# Altium footprint library TriggersLib.PcbLib: 262 footprints (part 1 of 17)
Each footprint in its own frame and in the unit in brackets; x right, y up, seen from the top. Pads: shape width x height; smd on the part's side, far side on the other; paste and mask are expansions set on the pad; w line width, h text height; cw(c..) or ccw(c..) is an arc to the next point about the centre after c.
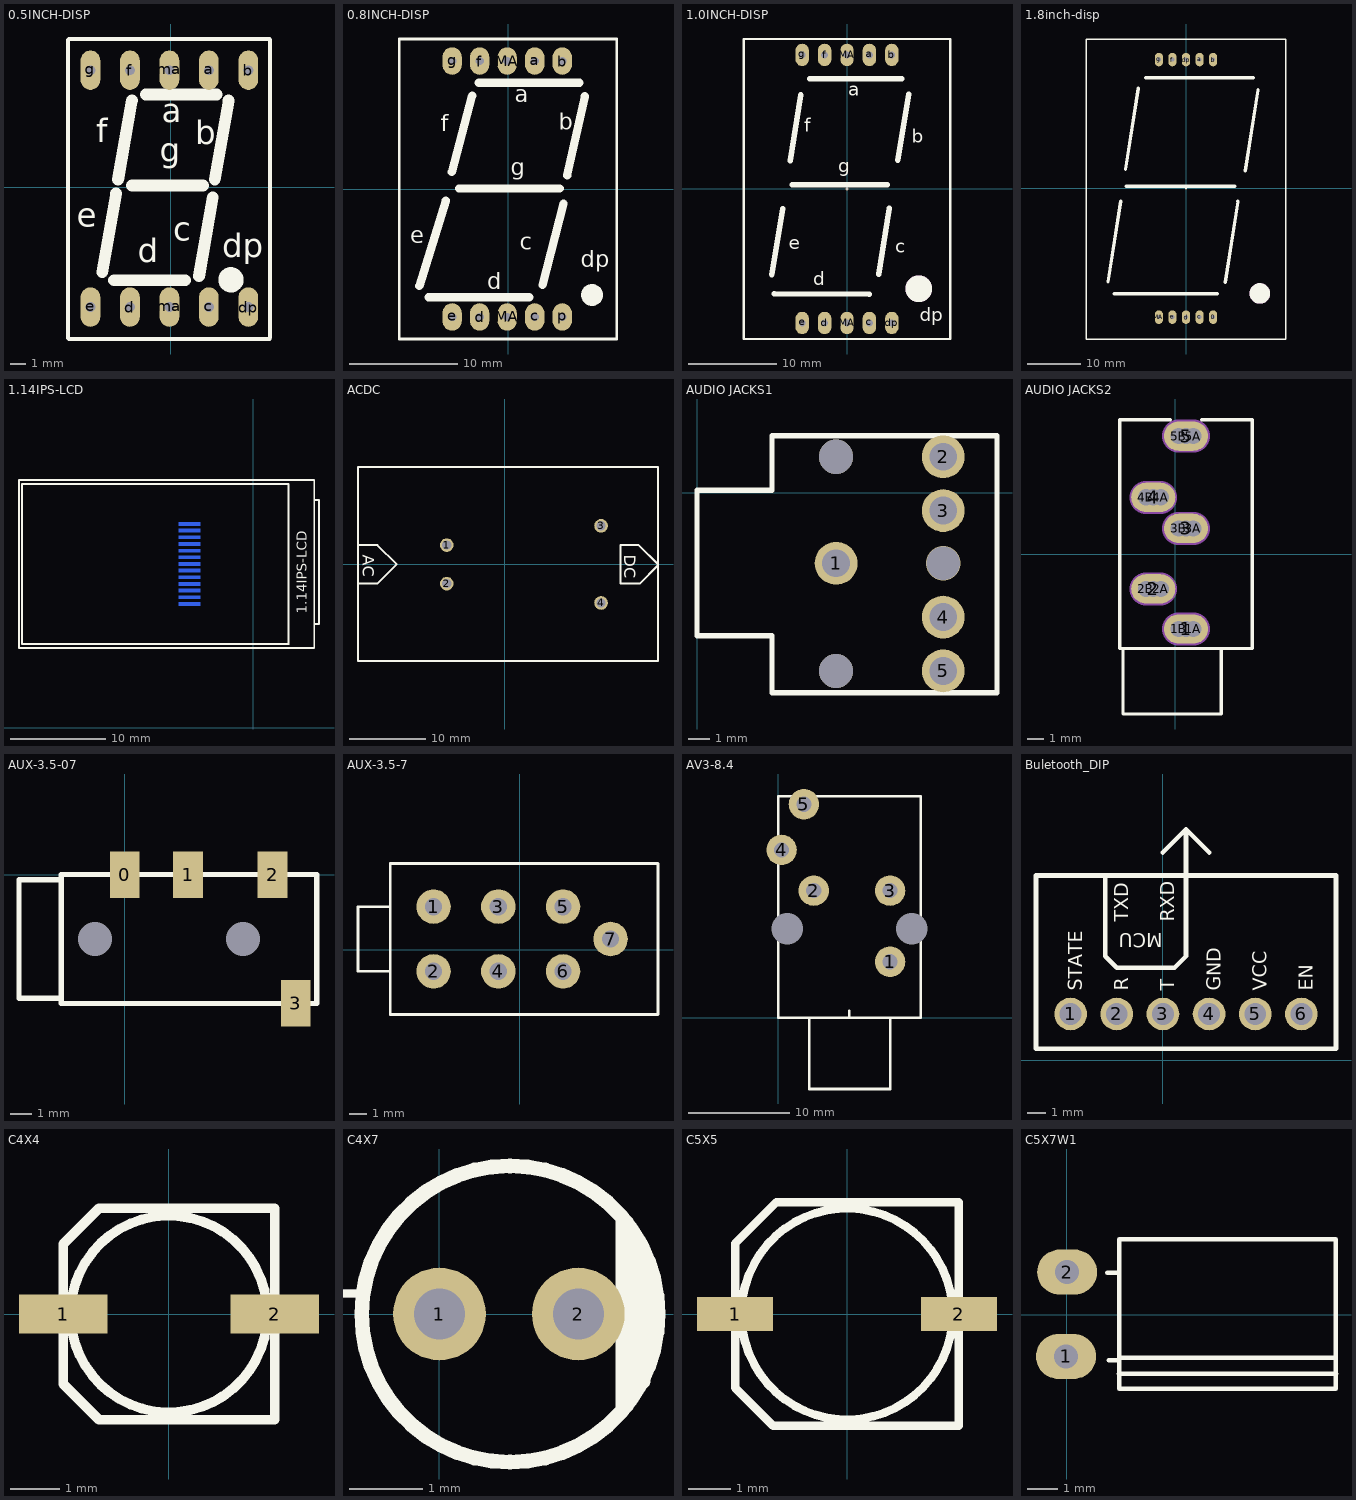
[diagram p0: the footprints below, top view; thin cyan lines are the x and y axes]

## 0.5INCH-DISP [mil]
pads (10):
  oval 50x100 hole 25: a(97,297) b(197,297) c(97,-303) d(-103,-303) dp(197,-303) e(-203,-303) f(-103,297) g(-203,297) ma(-3,-303) ma(-3,297)
Top Overlay:
  circle w40: c153,-234 r12
  lines w10: -260,-382 -260,374 ; -258,-384 251,-384 ; -258,376 251,376 ; 252,-380 252,374
  lines w30: -173,-215 -138,-15 ; -143,-235 37,-235 ; -133,20 -98,220 ; -98,5 82,5 ; -63,235 117,235 ; 72,-225 107,-25 ; 112,20 147,220
  text "c" at 7,-135 h60
  text "dp" at 131,-177 h60
  text "e" at -238,-100 h60
  text "d" at -83,-190 h60
  text "a" at -23,165 h60
  text "g" at -28,65 h60
  text "b" at 62,110 h60
  text "f" at -188,115 h60
3D body "0.5INCH-DISP.STEP": height 393.7, standoff 0, extent -257,-381.03 254.81,367

## 0.8INCH-DISP [mil]
pads (10):
  oval 70x100 hole 30: a(97,465) b(197,465) c(97,-465) d(-103,-465) e(-203,-465) f(-103,465) g(-203,465) MA(-3,-465) MA(-3,465) p(197,-465)
Top Overlay:
  circle w40: c305.31,-385 r19.68
  lines w10: -395,-545 -395,545 395,545 395,-545 -395,-545
  lines w30: -322,-352 -226,-42 ; -289,-393 77.14,-393 ; -204,62 -130,339 ; -177.68,2.24 188.47,2.24 ; -108,-478 -103,-473 ; -106.14,386 260,386 ; 125,-349 202,-53 ; 215,49 279,337
  text "a" at 25,315 h60
  text "g" at 10,50 h60
  text "c" at 43,-220 h60
  text "d" at -75,-365 h60
  text "e" at -355,-198 h60
  text "f" at -245,210 h60
  text "dp" at 265,-285 h60
  text "b" at 185,215 h60
3D body "0.8INCH-DISP.STEP": height 393.7, standoff 0, extent -395,-531.49 392.4,531.5

## 1.0INCH-DISP [mil]
pads (10):
  oval 60x100 hole 30: a(100,598) b(200,598) c(100,-598) d(-100,-598) dp(200,-598) e(-200,-598) f(-100,598) g(-200,598) MA(0,-598) MA(0,598)
Top Overlay:
  lines w2: -6,0 6,0 ; 0,-6 0,5
  lines w10: -461,-10 -461,10 ; -460.88,-669.58 -460.88,669 ; -459.88,-669.58 461,-669.58 461,669 -459.88,669
  lines w25: -335,-382 -287,-89 ; -324,-467 99,-470 ; -254,126 -206,419 ; -244,19 179,19 ; -167,492 245,492 ; 141,-380 189,-87 ; 227,129 275,422
  text "a" at 5,415 h60
  text "b" at 290,205 h60
  text "c" at 215,-285 h60
  text "d" at -150,-430 h60
  text "e" at -260,-270 h60
  text "f" at -190,255 h60
  text "dp" at 325,-590 h60
  text "g" at -40,75 h60
Top Overlay keep-out:
  circle w100: c320.57,-445 r9.43
3D body "1.0INCH-DISP.STEP": height 393.7, standoff 0, extent -454,-654 451.51,645.22

## 1.8inch-disp [mil]
pads (10):
  oval 60x100 hole 30: 0(200,-950) a(100,950) b(200,950) c(100,-950) d(0,-950) dp(0,950) e(-100,-950) f(-100,950) g(-200,950) MA(-200,-950)
Top Overlay:
  lines w2: -5,0 5,0 ; 0,-5 0,4
  lines w10: -736,-1111 736,-1111 736,1101.6 -736,1101.6 -736,-1111
  lines w25: -575,-691 -481,-93 ; -528,-778 230,-778 ; -446,139 -352,737 ; -442,15 359,15 ; -299,815 496,815 ; 289,-694 383,-96 ; 437,128 531,726
Top Overlay keep-out:
  circle w100: c544.39,-775 r25.61
3D body "1.8inch-disp.STEP": height 393.7, standoff 0, extent -733,-1106.36 723.7,1098.36

## 1.14IPS-LCD [mm] "1.14寸IPS-LCD裸屏SPI接口"
pads (13):
  rect 2.3x0.35 smd far side: 1(-6.7,21.4) 2(-6.7,20.7) 3(-6.7,20) 4(-6.7,19.3) 5(-6.7,18.6) 6(-6.7,17.9) 7(-6.7,17.2) 8(-6.7,16.5) 9(-6.7,15.8) 10(-6.7,15.1) 11(-6.7,14.4) 12(-6.7,13.7) 13(-6.7,13)
Top Overlay:
  lines w0.203: 6.4,10.9 6.9,10.9 6.9,23.9 6.4,23.9 ; -24.6,8.4 -24.6,26 6.4,26 6.4,8.4 -24.6,8.4 ; -24.31,8.8 3.7,8.8 3.71,8.81 3.71,25.6 -24.3,25.6 -24.3,8.81 -24.31,8.8
  text "1.14IPS-LCD" at 5.6,12 h1.02
Bottom Overlay:
  lines w0.203: -8.1,12.5 6.4,12.5 6.4,19.4 -1.1,19.4 -3.6,21.9 -8.1,21.9 -8.1,12.5

## ACDC [mm] "ACDC电源模块"
height 22
pads (4):
  round 1.8 hole 1.2: 1(-7.62,2.54) 2(-7.62,-2.54) 3(12.7,5.08) 4(12.7,-5.08)
Top Overlay:
  lines w0.254: -19.304,-2.54 -16.764,-2.54 -14.224,0 -16.764,2.54 -19.304,2.54 ; -19.304,-12.7 -19.304,12.8 20.196,12.8 20.196,-12.7 -19.304,-12.7 ; 15.24,-2.54 15.24,2.54 17.656,2.54 20.196,0 20.196,-0.124 17.78,-2.54 15.24,-2.54
  text "DC" at 15.748,1.27 h1.52
  text "AC" at -18.669,1.27 h1.52

## AUDIO JACKS1 [mm]
pads (5):
  round 2 hole 1.3: 1(6.502,-3.302) 2(11.506,1.676) 3(11.506,-0.838) 4(11.506,-5.817) 5(11.506,-8.331)
via 6.502,1.676 diameter 1.6 hole 1.6
via 6.502,-8.331 diameter 1.6 hole 1.6
via 11.506,-3.302 diameter 1.6 hole 1.56
Top Overlay:
  lines w0.254: 0,-6.68 3.505,-6.68 3.505,-9.347 14.021,-9.347 14.021,2.667 3.505,2.667 3.505,0.102 0,0.102 0,-6.68
3D body "sj1-3545n(AUDIO JACKS).stp": height 11.1, standoff -3.9, extent 0.011,-9.377 15.011,2.823

## AUDIO JACKS2 [mm]
pads (15):
  oval 2.7x1.8 hole 1: 1(0.672,-4.579) 2(-1.328,-2.129) 3(0.672,1.571) 4(-1.328,3.471) 5(0.672,7.221)
  round 1.2 hole 1: 1A(1.122,-4.579) 1B(0.222,-4.579) 2A(-0.878,-2.129) 2B(-1.778,-2.129) 3A(1.122,1.571) 3B(0.222,1.571) 4A(-0.878,3.471) 4B(-1.778,3.471) 5A(1.122,7.221) 5B(0.222,7.221)
Top Overlay:
  lines w0.2: -3.178,-5.779 -3.178,-9.779 2.822,-9.779 2.822,-5.779 ; -0.278,8.221 -3.378,8.221 -3.378,-5.779 4.722,-5.779 4.722,8.221 1.622,8.221
Mechanical 2:
  lines w2.016: -1.778,-2.129 -0.878,-2.129 ; -1.778,3.471 -0.878,3.471 ; 0.222,-4.579 1.122,-4.579 ; 0.222,1.571 1.122,1.571 ; 0.222,7.221 1.122,7.221
3D body "AUDIO JACK.stp": height 5.3, standoff -10.3, extent -3.478,-9.779 4.722,8.221

## AUX-3.5-07 [mm]
pads (6):
  rect 1.4x2.2 smd: 0(-0.012,0) 1(2.988,0) 2(6.988,0) 3(8.088,-6.1)
  round 1 hole 1.6: ""(-1.412,-3.05) ""(5.588,-3.05)
Top Overlay:
  lines w0.254: -3.012,-5.85 -5.012,-5.85 -5.012,-0.25 -3.012,-0.25 ; -3.012,-5.85 -3.012,-0.25 ; -3.012,-5.85 -3.012,-6.1 9.088,-6.1 9.088,0 -3.012,0 -3.012,-0.25
3D body "SW3dPS-audio_buchse.STEP": height 4.06, standoff -0.01, extent -4.178,-6.507 7.792,0.827

## AUX-3.5-7 [mil]
pads (7):
  round 80 hole 40: 1(-200,100) 2(-200,-50) 3(-50,100) 4(-50,-50) 5(100,100) 6(100,-50) 7(210,25)
Top Overlay:
  lines w6: -300,-50 -375,-50 -375,100 -300,100 ; -300,-150 320,-150 320,-100 320,200 -300,200 -300,-100 -300,-150

## AV3-8.4 [mm]
pads (7):
  round 3 hole 1.5: 1(11,5.5) 2(3.5,12.5) 3(11,12.5) 4(0.325,16.5) 5(2.525,21)
  round 3 hole 3.1 unplated: ""(0.9,8.75) ""(13.15,8.75)
Top Overlay:
  lines w0.254: 3.04,0 3.04,-7.02 11.02,-7.02 11.02,0 ; 7,0 7,0.66 ; 0,0 0,21.8 14,21.8 14,0 0,0
3D body "User Library-Mouser_161-4320.STEP": height 40.92, standoff -4.32, extent 0.3,-8.208 17.115,23.008

## Buletooth_DIP [mm]
pads (6):
  round 1.8 hole 1.2: 1(-5.08,2.54) 2(-2.54,2.54) 3(0,2.54) 4(2.54,2.54) 5(5.08,2.54) 6(7.62,2.54)
Top Overlay:
  lines w0.254: -3.175,10.16 -3.175,5.715 -2.54,5.08 0.635,5.08 1.27,5.715 1.27,10.16 1.27,12.7 ; 0,11.43 1.27,12.7 ; 2.54,11.43 1.27,12.7 ; -6.985,0.635 -6.985,10.16 9.525,10.16 9.525,0.635 -6.985,0.635
  text "T" at 0.635,3.81 h0.76
  text "R" at -1.905,3.81 h0.76
  text "MCU" at 0,6.985 h0.76
  text "EN" at 8.255,3.81 h0.76
  text "VCC" at 5.715,3.81 h0.76
  text "GND" at 3.175,3.81 h0.76
  text "TXD" at -1.905,7.62 h0.76
  text "RXD" at 0.635,7.62 h0.76
  text "STATE" at -4.445,3.81 h0.76

## C4X4 [mm]
height 5.5
pads (2):
  rect 1.8x0.8 smd: 1(-2.15,0) 2(2.15,0)
Top Overlay:
  circle w0.2: c0,0 r2
  lines w0.2: -1.433,-2.139 -2.15,-1.422 ; -1.433,2.139 -2.15,1.422 ; -2.15,-1.422 -1.422,-2.15 2.15,-2.15 2.15,2.15 -1.422,2.15 -2.15,1.422 ; -2.15,-1.422 -2.15,1.422
3D body "SL-B.step": height 5.2, standoff 0, extent -2.286,-2.159 2.314,2.141

## C4X7 [mm]
pads (2):
  round 1.27 hole 0.7: 1(0,0) 2(1.905,0)
Top Overlay:
  circle w0.203: c0.965,0 r2.032
  lines w0.254: 2.54,-1.245 2.54,1.245 ; 2.769,-0.914 2.769,0.864
  text "+" at -1.118,-0.305 h1.02
3D body "Cap 4x7.STEP": height 7.01, standoff -16.99, extent -1.028,-1.981 2.972,2.019

## C5X5 [mm]
height 5.5
pads (2):
  rect 1.8x0.8 smd: 1(-2.65,0) 2(2.65,0)
Top Overlay:
  circle w0.2: c0,0 r2.5
  lines w0.2: -2.65,-1.744 -1.744,-2.65 2.65,-2.65 2.65,2.65 -1.668,2.65 -2.65,1.668 -2.65,-1.744
3D body "SL-D.step": height 5.2, standoff 0, extent -2.8,-2.667 2.8,2.633

## C5X7W1 [mm]
pads (2):
  oval 2x1.5 hole 0.8: 1(-0.024,-1.38) 2(0.012,1.428)
Top Overlay:
  lines w0.152: 1.351,1.409 1.684,1.409 ; 1.4,-1.513 1.723,-1.513 ; 1.729,-1.956 8.96,-1.956 ; 1.784,-1.422 8.905,-1.422 ; 1.75,-2.459 8.95,-2.459 8.95,2.525 1.75,2.525 1.75,-2.459
3D body "3HW1L1.STEP": height 2.7, standoff -1.5, extent -0.233,0.75 2.433,1.823
3D body "3HW1L1.STEP": height 2.7, standoff -1.5, extent -0.216,-1.76 2.465,-0.905
3D body "User Library-Cap electro 5x7x2mm RA_.STEP": height 5.13, standoff 0.07, extent 1.731,-2.49 9.007,2.561